# Altium footprint library con-samtec.PCBLIB: 805 footprints (part 21 of 55)
Each footprint in its own frame and in the unit in brackets; x right, y up, seen from the top. Pads: shape width x height; smd on the part's side, far side on the other; paste and mask are expansions set on the pad; w line width, h text height; cw(c..) or ccw(c..) is an arc to the next point about the centre after c.
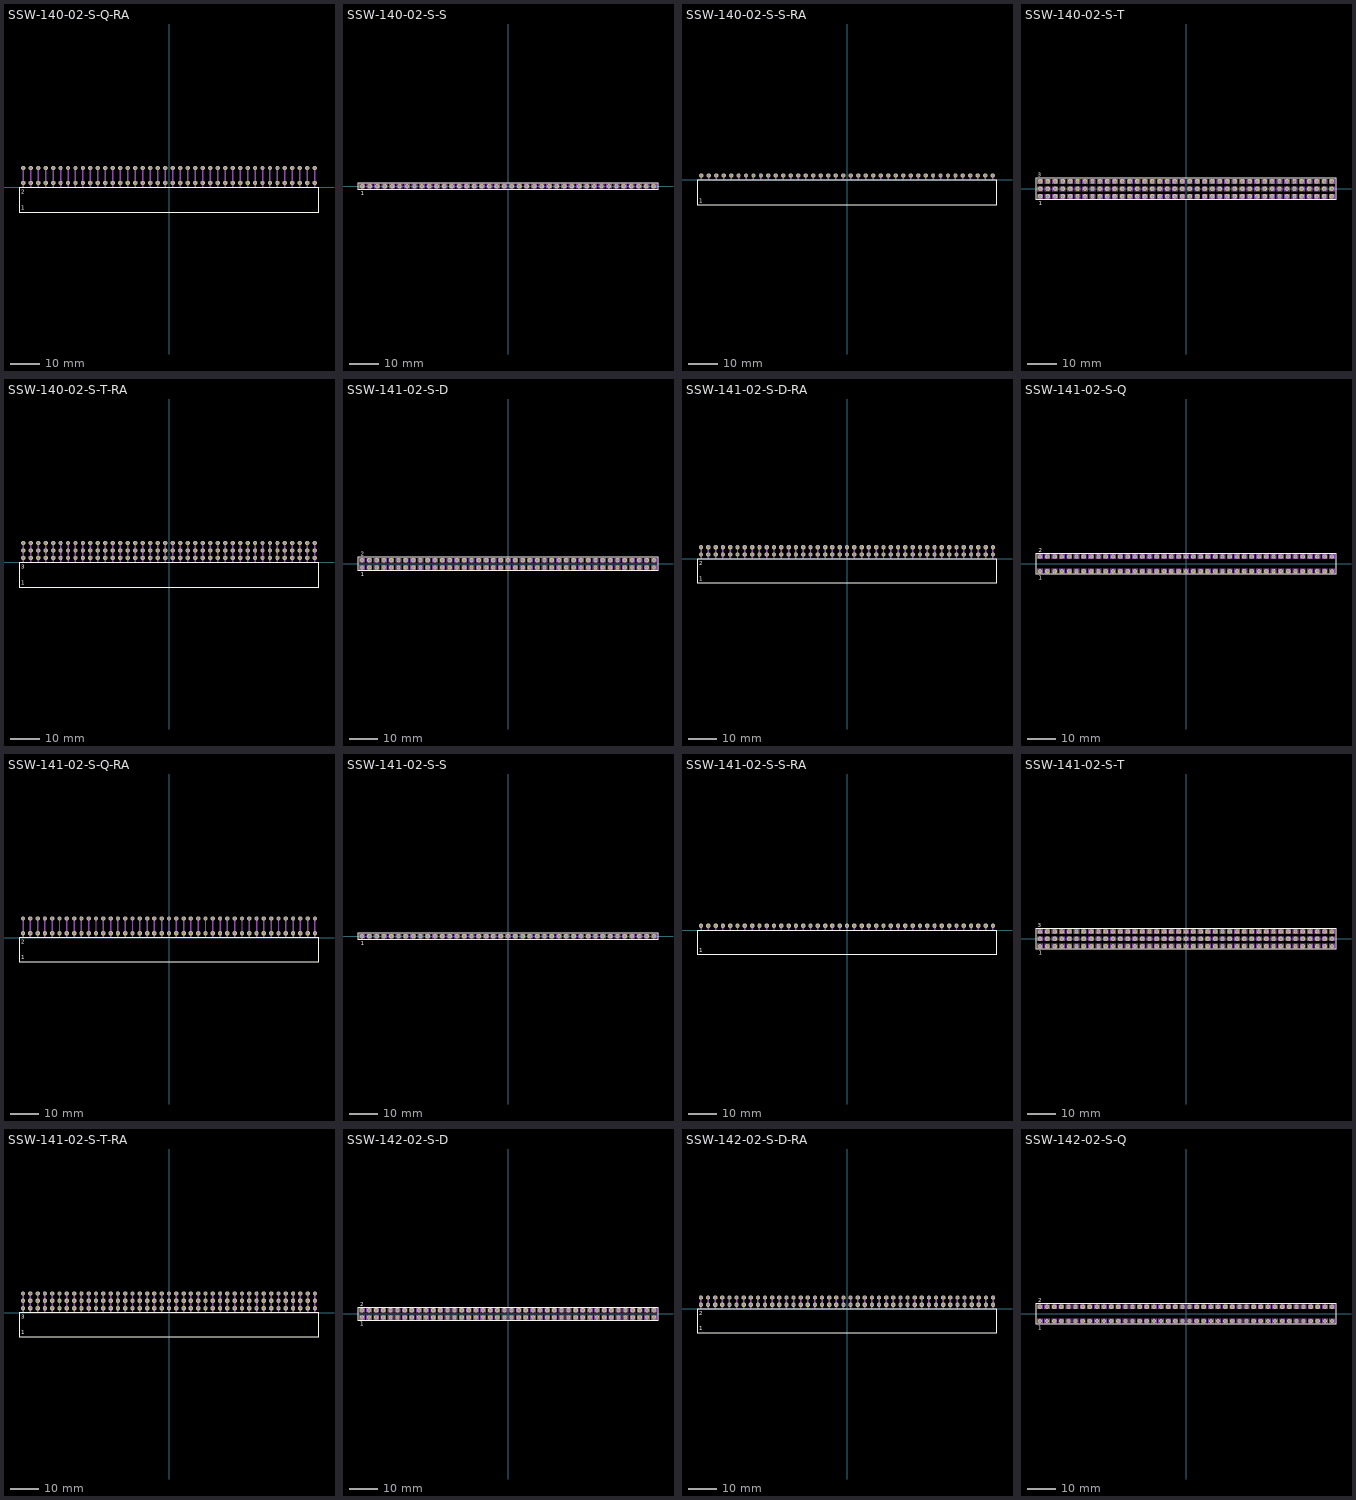
[diagram p20: the footprints below, top view; thin cyan lines are the x and y axes]

## SSW-140-02-S-Q-RA [mil]
pads (80):
  oct 59.06x59.06 hole 39.37: 1(-1950,60) 2(-1950,260) 3(-1850,60) 4(-1850,260) 5(-1750,60) 6(-1750,260) 7(-1650,60) 8(-1650,260) 9(-1550,60) 10(-1550,260) 11(-1450,60) 12(-1450,260) 13(-1350,60) 14(-1350,260) 15(-1250,60) 16(-1250,260) 17(-1150,60) 18(-1150,260) 19(-1050,60) 20(-1050,260) 21(-950,60) 22(-950,260) 23(-850,60) 24(-850,260) 25(-750,60) 26(-750,260) 27(-650,60) 28(-650,260) 29(-550,60) 30(-550,260) 31(-450,60) 32(-450,260) 33(-350,60) 34(-350,260) 35(-250,60) 36(-250,260) 37(-150,60) 38(-150,260) 39(-50,60) 40(-50,260) 41(50,60) 42(50,260) 43(150,60) 44(150,260) 45(250,60) 46(250,260) 47(350,60) 48(350,260) 49(450,60) 50(450,260) 51(550,60) 52(550,260) 53(650,60) 54(650,260) 55(750,60) 56(750,260) 57(850,60) 58(850,260) 59(950,60) 60(950,260) 61(1050,60) 62(1050,260) 63(1150,60) 64(1150,260) 65(1250,60) 66(1250,260) 67(1350,60) 68(1350,260) 69(1450,60) 70(1450,260) 71(1550,60) 72(1550,260) 73(1650,60) 74(1650,260) 75(1750,60) 76(1750,260) 77(1850,60) 78(1850,260) 79(1950,60) 80(1950,260)
Top Overlay:
  lines w8: -2005.08,-330.55 2005.08,-330.55 2005.08,-4.17 -2005.08,-4.17 -2005.08,-330.55
  text "1" at -1973.43,-301.18 h56.1
  text "2" at -1976.38,-86.61 h56.1
Mechanical 16:
  rectangle: -1960,0 -1940,270
  rectangle: -1860,0 -1840,270
  rectangle: -1760,0 -1740,270
  rectangle: -1660,0 -1640,270
  rectangle: -1560,0 -1540,270
  rectangle: -1460,0 -1440,270
  rectangle: -1360,0 -1340,270
  rectangle: -1260,0 -1240,270
  rectangle: -1160,0 -1140,270
  rectangle: -1060,0 -1040,270
  rectangle: -960,0 -940,270
  rectangle: -860,0 -840,270
  rectangle: -760,0 -740,270
  rectangle: -660,0 -640,270
  rectangle: -560,0 -540,270
  rectangle: -460,0 -440,270
  rectangle: -360,0 -340,270
  rectangle: -260,0 -240,270
  rectangle: -160,0 -140,270
  rectangle: -60,0 -40,270
  rectangle: 40,0 60,270
  rectangle: 140,0 160,270
  rectangle: 240,0 260,270
  rectangle: 340,0 360,270
  rectangle: 440,0 460,270
  rectangle: 540,0 560,270
  rectangle: 640,0 660,270
  rectangle: 740,0 760,270
  rectangle: 840,0 860,270
  rectangle: 940,0 960,270
  rectangle: 1040,0 1060,270
  rectangle: 1140,0 1160,270
  rectangle: 1240,0 1260,270
  rectangle: 1340,0 1360,270
  rectangle: 1440,0 1460,270
  rectangle: 1540,0 1560,270
  rectangle: 1640,0 1660,270
  rectangle: 1740,0 1760,270
  rectangle: 1840,0 1860,270
  rectangle: 1940,0 1960,270

## SSW-140-02-S-S [mm]
pads (40):
  oct 1.5x1.5 hole 1: 1(-49.53,0) 2(-46.99,0) 3(-44.45,0) 4(-41.91,0) 5(-39.37,0) 6(-36.83,0) 7(-34.29,0) 8(-31.75,0) 9(-29.21,0) 10(-26.67,0) 11(-24.13,0) 12(-21.59,0) 13(-19.05,0) 14(-16.51,0) 15(-13.97,0) 16(-11.43,0) 17(-8.89,0) 18(-6.35,0) 19(-3.81,0) 20(-1.27,0) 21(1.27,0) 22(3.81,0) 23(6.35,0) 24(8.89,0) 25(11.43,0) 26(13.97,0) 27(16.51,0) 28(19.05,0) 29(21.59,0) 30(24.13,0) 31(26.67,0) 32(29.21,0) 33(31.75,0) 34(34.29,0) 35(36.83,0) 36(39.37,0) 37(41.91,0) 38(44.45,0) 39(46.99,0) 40(49.53,0)
Top Overlay:
  lines w0.203: -50.929,-1.155 50.929,-1.155 50.929,1.155 -50.929,1.155 -50.929,-1.155
  text "1" at -50.038,-3.048 h1.42
Mechanical 16:
  drawing of 160 lines, arcs and shapes, not listed

## SSW-140-02-S-S-RA [mil]
pads (40):
  oct 59.06x59.06 hole 39.37: 1(-1950,60) 2(-1850,60) 3(-1750,60) 4(-1650,60) 5(-1550,60) 6(-1450,60) 7(-1350,60) 8(-1250,60) 9(-1150,60) 10(-1050,60) 11(-950,60) 12(-850,60) 13(-750,60) 14(-650,60) 15(-550,60) 16(-450,60) 17(-350,60) 18(-250,60) 19(-150,60) 20(-50,60) 21(50,60) 22(150,60) 23(250,60) 24(350,60) 25(450,60) 26(550,60) 27(650,60) 28(750,60) 29(850,60) 30(950,60) 31(1050,60) 32(1150,60) 33(1250,60) 34(1350,60) 35(1450,60) 36(1550,60) 37(1650,60) 38(1750,60) 39(1850,60) 40(1950,60)
Top Overlay:
  lines w8: -2005.08,-330.55 2005.08,-330.55 2005.08,-4.17 -2005.08,-4.17 -2005.08,-330.55
  text "1" at -1973.43,-301.18 h56.1
Mechanical 16:
  rectangle: -1960,0 -1940,70
  rectangle: -1860,0 -1840,70
  rectangle: -1760,0 -1740,70
  rectangle: -1660,0 -1640,70
  rectangle: -1560,0 -1540,70
  rectangle: -1460,0 -1440,70
  rectangle: -1360,0 -1340,70
  rectangle: -1260,0 -1240,70
  rectangle: -1160,0 -1140,70
  rectangle: -1060,0 -1040,70
  rectangle: -960,0 -940,70
  rectangle: -860,0 -840,70
  rectangle: -760,0 -740,70
  rectangle: -660,0 -640,70
  rectangle: -560,0 -540,70
  rectangle: -460,0 -440,70
  rectangle: -360,0 -340,70
  rectangle: -260,0 -240,70
  rectangle: -160,0 -140,70
  rectangle: -60,0 -40,70
  rectangle: 40,0 60,70
  rectangle: 140,0 160,70
  rectangle: 240,0 260,70
  rectangle: 340,0 360,70
  rectangle: 440,0 460,70
  rectangle: 540,0 560,70
  rectangle: 640,0 660,70
  rectangle: 740,0 760,70
  rectangle: 840,0 860,70
  rectangle: 940,0 960,70
  rectangle: 1040,0 1060,70
  rectangle: 1140,0 1160,70
  rectangle: 1240,0 1260,70
  rectangle: 1340,0 1360,70
  rectangle: 1440,0 1460,70
  rectangle: 1540,0 1560,70
  rectangle: 1640,0 1660,70
  rectangle: 1740,0 1760,70
  rectangle: 1840,0 1860,70
  rectangle: 1940,0 1960,70

## SSW-140-02-S-T [mm]
pads (120):
  oct 1.5x1.5 hole 1: 1(-49.53,-2.54) 2(-49.53,0) 3(-49.53,2.54) 4(-46.99,-2.54) 5(-46.99,0) 6(-46.99,2.54) 7(-44.45,-2.54) 8(-44.45,0) 9(-44.45,2.54) 10(-41.91,-2.54) 11(-41.91,0) 12(-41.91,2.54) 13(-39.37,-2.54) 14(-39.37,0) 15(-39.37,2.54) 16(-36.83,-2.54) 17(-36.83,0) 18(-36.83,2.54) 19(-34.29,-2.54) 20(-34.29,0) 21(-34.29,2.54) 22(-31.75,-2.54) 23(-31.75,0) 24(-31.75,2.54) 25(-29.21,-2.54) 26(-29.21,0) 27(-29.21,2.54) 28(-26.67,-2.54) 29(-26.67,0) 30(-26.67,2.54) 31(-24.13,-2.54) 32(-24.13,0) 33(-24.13,2.54) 34(-21.59,-2.54) 35(-21.59,0) 36(-21.59,2.54) 37(-19.05,-2.54) 38(-19.05,0) 39(-19.05,2.54) 40(-16.51,-2.54) 41(-16.51,0) 42(-16.51,2.54) 43(-13.97,-2.54) 44(-13.97,0) 45(-13.97,2.54) 46(-11.43,-2.54) 47(-11.43,0) 48(-11.43,2.54) 49(-8.89,-2.54) 50(-8.89,0) 51(-8.89,2.54) 52(-6.35,-2.54) 53(-6.35,0) 54(-6.35,2.54) 55(-3.81,-2.54) 56(-3.81,0) 57(-3.81,2.54) 58(-1.27,-2.54) 59(-1.27,0) 60(-1.27,2.54) 61(1.27,-2.54) 62(1.27,0) 63(1.27,2.54) 64(3.81,-2.54) 65(3.81,0) 66(3.81,2.54) 67(6.35,-2.54) 68(6.35,0) 69(6.35,2.54) 70(8.89,-2.54) 71(8.89,0) 72(8.89,2.54) 73(11.43,-2.54) 74(11.43,0) 75(11.43,2.54) 76(13.97,-2.54) 77(13.97,0) 78(13.97,2.54) 79(16.51,-2.54) 80(16.51,0) 81(16.51,2.54) 82(19.05,-2.54) 83(19.05,0) 84(19.05,2.54) 85(21.59,-2.54) 86(21.59,0) 87(21.59,2.54) 88(24.13,-2.54) 89(24.13,0) 90(24.13,2.54) 91(26.67,-2.54) 92(26.67,0) 93(26.67,2.54) 94(29.21,-2.54) 95(29.21,0) 96(29.21,2.54) 97(31.75,-2.54) 98(31.75,0) 99(31.75,2.54) 100(34.29,-2.54) 101(34.29,0) 102(34.29,2.54) 103(36.83,-2.54) 104(36.83,0) 105(36.83,2.54) 106(39.37,-2.54) 107(39.37,0) 108(39.37,2.54) 109(41.91,-2.54) 110(41.91,0) 111(41.91,2.54) 112(44.45,-2.54) 113(44.45,0) 114(44.45,2.54) 115(46.99,-2.54) 116(46.99,0) 117(46.99,2.54) 118(49.53,-2.54) 119(49.53,0) 120(49.53,2.54)
Top Overlay:
  lines w0.203: -50.929,-3.695 50.929,-3.695 50.929,3.695 -50.929,3.695 -50.929,-3.695
  text "1" at -50.038,-5.588 h1.42
  text "3" at -50.292,4.064 h1.42
Mechanical 16:
  drawing of 480 lines, arcs and shapes, not listed

## SSW-140-02-S-T-RA [mil]
pads (120):
  oct 59.06x59.06 hole 39.37: 1(-1950,60) 2(-1950,160) 3(-1950,260) 4(-1850,60) 5(-1850,160) 6(-1850,260) 7(-1750,60) 8(-1750,160) 9(-1750,260) 10(-1650,60) 11(-1650,160) 12(-1650,260) 13(-1550,60) 14(-1550,160) 15(-1550,260) 16(-1450,60) 17(-1450,160) 18(-1450,260) 19(-1350,60) 20(-1350,160) 21(-1350,260) 22(-1250,60) 23(-1250,160) 24(-1250,260) 25(-1150,60) 26(-1150,160) 27(-1150,260) 28(-1050,60) 29(-1050,160) 30(-1050,260) 31(-950,60) 32(-950,160) 33(-950,260) 34(-850,60) 35(-850,160) 36(-850,260) 37(-750,60) 38(-750,160) 39(-750,260) 40(-650,60) 41(-650,160) 42(-650,260) 43(-550,60) 44(-550,160) 45(-550,260) 46(-450,60) 47(-450,160) 48(-450,260) 49(-350,60) 50(-350,160) 51(-350,260) 52(-250,60) 53(-250,160) 54(-250,260) 55(-150,60) 56(-150,160) 57(-150,260) 58(-50,60) 59(-50,160) 60(-50,260) 61(50,60) 62(50,160) 63(50,260) 64(150,60) 65(150,160) 66(150,260) 67(250,60) 68(250,160) 69(250,260) 70(350,60) 71(350,160) 72(350,260) 73(450,60) 74(450,160) 75(450,260) 76(550,60) 77(550,160) 78(550,260) 79(650,60) 80(650,160) 81(650,260) 82(750,60) 83(750,160) 84(750,260) 85(850,60) 86(850,160) 87(850,260) 88(950,60) 89(950,160) 90(950,260) 91(1050,60) 92(1050,160) 93(1050,260) 94(1150,60) 95(1150,160) 96(1150,260) 97(1250,60) 98(1250,160) 99(1250,260) 100(1350,60) 101(1350,160) 102(1350,260) 103(1450,60) 104(1450,160) 105(1450,260) 106(1550,60) 107(1550,160) 108(1550,260) 109(1650,60) 110(1650,160) 111(1650,260) 112(1750,60) 113(1750,160) 114(1750,260) 115(1850,60) 116(1850,160) 117(1850,260) 118(1950,60) 119(1950,160) 120(1950,260)
Top Overlay:
  lines w8: -2005.08,-330.55 2005.08,-330.55 2005.08,-4.17 -2005.08,-4.17 -2005.08,-330.55
  text "1" at -1973.43,-301.18 h56.1
  text "3" at -1976.38,-86.61 h56.1
Mechanical 16:
  rectangle: -1960,0 -1940,270
  rectangle: -1860,0 -1840,270
  rectangle: -1760,0 -1740,270
  rectangle: -1660,0 -1640,270
  rectangle: -1560,0 -1540,270
  rectangle: -1460,0 -1440,270
  rectangle: -1360,0 -1340,270
  rectangle: -1260,0 -1240,270
  rectangle: -1160,0 -1140,270
  rectangle: -1060,0 -1040,270
  rectangle: -960,0 -940,270
  rectangle: -860,0 -840,270
  rectangle: -760,0 -740,270
  rectangle: -660,0 -640,270
  rectangle: -560,0 -540,270
  rectangle: -460,0 -440,270
  rectangle: -360,0 -340,270
  rectangle: -260,0 -240,270
  rectangle: -160,0 -140,270
  rectangle: -60,0 -40,270
  rectangle: 40,0 60,270
  rectangle: 140,0 160,270
  rectangle: 240,0 260,270
  rectangle: 340,0 360,270
  rectangle: 440,0 460,270
  rectangle: 540,0 560,270
  rectangle: 640,0 660,270
  rectangle: 740,0 760,270
  rectangle: 840,0 860,270
  rectangle: 940,0 960,270
  rectangle: 1040,0 1060,270
  rectangle: 1140,0 1160,270
  rectangle: 1240,0 1260,270
  rectangle: 1340,0 1360,270
  rectangle: 1440,0 1460,270
  rectangle: 1540,0 1560,270
  rectangle: 1640,0 1660,270
  rectangle: 1740,0 1760,270
  rectangle: 1840,0 1860,270
  rectangle: 1940,0 1960,270

## SSW-141-02-S-D [mm]
pads (82):
  oct 1.5x1.5 hole 1: 1(-50.8,-1.27) 2(-50.8,1.27) 3(-48.26,-1.27) 4(-48.26,1.27) 5(-45.72,-1.27) 6(-45.72,1.27) 7(-43.18,-1.27) 8(-43.18,1.27) 9(-40.64,-1.27) 10(-40.64,1.27) 11(-38.1,-1.27) 12(-38.1,1.27) 13(-35.56,-1.27) 14(-35.56,1.27) 15(-33.02,-1.27) 16(-33.02,1.27) 17(-30.48,-1.27) 18(-30.48,1.27) 19(-27.94,-1.27) 20(-27.94,1.27) 21(-25.4,-1.27) 22(-25.4,1.27) 23(-22.86,-1.27) 24(-22.86,1.27) 25(-20.32,-1.27) 26(-20.32,1.27) 27(-17.78,-1.27) 28(-17.78,1.27) 29(-15.24,-1.27) 30(-15.24,1.27) 31(-12.7,-1.27) 32(-12.7,1.27) 33(-10.16,-1.27) 34(-10.16,1.27) 35(-7.62,-1.27) 36(-7.62,1.27) 37(-5.08,-1.27) 38(-5.08,1.27) 39(-2.54,-1.27) 40(-2.54,1.27) 41(0,-1.27) 42(0,1.27) 43(2.54,-1.27) 44(2.54,1.27) 45(5.08,-1.27) 46(5.08,1.27) 47(7.62,-1.27) 48(7.62,1.27) 49(10.16,-1.27) 50(10.16,1.27) 51(12.7,-1.27) 52(12.7,1.27) 53(15.24,-1.27) 54(15.24,1.27) 55(17.78,-1.27) 56(17.78,1.27) 57(20.32,-1.27) 58(20.32,1.27) 59(22.86,-1.27) 60(22.86,1.27) 61(25.4,-1.27) 62(25.4,1.27) 63(27.94,-1.27) 64(27.94,1.27) 65(30.48,-1.27) 66(30.48,1.27) 67(33.02,-1.27) 68(33.02,1.27) 69(35.56,-1.27) 70(35.56,1.27) 71(38.1,-1.27) 72(38.1,1.27) 73(40.64,-1.27) 74(40.64,1.27) 75(43.18,-1.27) 76(43.18,1.27) 77(45.72,-1.27) 78(45.72,1.27) 79(48.26,-1.27) 80(48.26,1.27) 81(50.8,-1.27) 82(50.8,1.27)
Top Overlay:
  lines w0.203: -52.199,-2.425 52.199,-2.425 52.199,2.425 -52.199,2.425 -52.199,-2.425
  text "1" at -51.308,-4.318 h1.42
  text "2" at -51.308,2.794 h1.42
Mechanical 16:
  drawing of 328 lines, arcs and shapes, not listed

## SSW-141-02-S-D-RA [mil]
pads (82):
  oct 59.06x59.06 hole 39.37: 1(-2000,60) 2(-2000,160) 3(-1900,60) 4(-1900,160) 5(-1800,60) 6(-1800,160) 7(-1700,60) 8(-1700,160) 9(-1600,60) 10(-1600,160) 11(-1500,60) 12(-1500,160) 13(-1400,60) 14(-1400,160) 15(-1300,60) 16(-1300,160) 17(-1200,60) 18(-1200,160) 19(-1100,60) 20(-1100,160) 21(-1000,60) 22(-1000,160) 23(-900,60) 24(-900,160) 25(-800,60) 26(-800,160) 27(-700,60) 28(-700,160) 29(-600,60) 30(-600,160) 31(-500,60) 32(-500,160) 33(-400,60) 34(-400,160) 35(-300,60) 36(-300,160) 37(-200,60) 38(-200,160) 39(-100,60) 40(-100,160) 41(0,60) 42(0,160) 43(100,60) 44(100,160) 45(200,60) 46(200,160) 47(300,60) 48(300,160) 49(400,60) 50(400,160) 51(500,60) 52(500,160) 53(600,60) 54(600,160) 55(700,60) 56(700,160) 57(800,60) 58(800,160) 59(900,60) 60(900,160) 61(1000,60) 62(1000,160) 63(1100,60) 64(1100,160) 65(1200,60) 66(1200,160) 67(1300,60) 68(1300,160) 69(1400,60) 70(1400,160) 71(1500,60) 72(1500,160) 73(1600,60) 74(1600,160) 75(1700,60) 76(1700,160) 77(1800,60) 78(1800,160) 79(1900,60) 80(1900,160) 81(2000,60) 82(2000,160)
Top Overlay:
  lines w8: -2055.08,-330.55 2055.08,-330.55 2055.08,-4.17 -2055.08,-4.17 -2055.08,-330.55
  text "1" at -2023.43,-301.18 h56.1
  text "2" at -2026.38,-86.61 h56.1
Mechanical 16:
  rectangle: -2010,0 -1990,170
  rectangle: -1910,0 -1890,170
  rectangle: -1810,0 -1790,170
  rectangle: -1710,0 -1690,170
  rectangle: -1610,0 -1590,170
  rectangle: -1510,0 -1490,170
  rectangle: -1410,0 -1390,170
  rectangle: -1310,0 -1290,170
  rectangle: -1210,0 -1190,170
  rectangle: -1110,0 -1090,170
  rectangle: -1010,0 -990,170
  rectangle: -910,0 -890,170
  rectangle: -810,0 -790,170
  rectangle: -710,0 -690,170
  rectangle: -610,0 -590,170
  rectangle: -510,0 -490,170
  rectangle: -410,0 -390,170
  rectangle: -310,0 -290,170
  rectangle: -210,0 -190,170
  rectangle: -110,0 -90,170
  rectangle: -10,0 10,170
  rectangle: 90,0 110,170
  rectangle: 190,0 210,170
  rectangle: 290,0 310,170
  rectangle: 390,0 410,170
  rectangle: 490,0 510,170
  rectangle: 590,0 610,170
  rectangle: 690,0 710,170
  rectangle: 790,0 810,170
  rectangle: 890,0 910,170
  rectangle: 990,0 1010,170
  rectangle: 1090,0 1110,170
  rectangle: 1190,0 1210,170
  rectangle: 1290,0 1310,170
  rectangle: 1390,0 1410,170
  rectangle: 1490,0 1510,170
  rectangle: 1590,0 1610,170
  rectangle: 1690,0 1710,170
  rectangle: 1790,0 1810,170
  rectangle: 1890,0 1910,170
  rectangle: 1990,0 2010,170

## SSW-141-02-S-Q [mm]
pads (82):
  oct 1.5x1.5 hole 1: 1(-50.8,-2.54) 2(-50.8,2.54) 3(-48.26,-2.54) 4(-48.26,2.54) 5(-45.72,-2.54) 6(-45.72,2.54) 7(-43.18,-2.54) 8(-43.18,2.54) 9(-40.64,-2.54) 10(-40.64,2.54) 11(-38.1,-2.54) 12(-38.1,2.54) 13(-35.56,-2.54) 14(-35.56,2.54) 15(-33.02,-2.54) 16(-33.02,2.54) 17(-30.48,-2.54) 18(-30.48,2.54) 19(-27.94,-2.54) 20(-27.94,2.54) 21(-25.4,-2.54) 22(-25.4,2.54) 23(-22.86,-2.54) 24(-22.86,2.54) 25(-20.32,-2.54) 26(-20.32,2.54) 27(-17.78,-2.54) 28(-17.78,2.54) 29(-15.24,-2.54) 30(-15.24,2.54) 31(-12.7,-2.54) 32(-12.7,2.54) 33(-10.16,-2.54) 34(-10.16,2.54) 35(-7.62,-2.54) 36(-7.62,2.54) 37(-5.08,-2.54) 38(-5.08,2.54) 39(-2.54,-2.54) 40(-2.54,2.54) 41(0,-2.54) 42(0,2.54) 43(2.54,-2.54) 44(2.54,2.54) 45(5.08,-2.54) 46(5.08,2.54) 47(7.62,-2.54) 48(7.62,2.54) 49(10.16,-2.54) 50(10.16,2.54) 51(12.7,-2.54) 52(12.7,2.54) 53(15.24,-2.54) 54(15.24,2.54) 55(17.78,-2.54) 56(17.78,2.54) 57(20.32,-2.54) 58(20.32,2.54) 59(22.86,-2.54) 60(22.86,2.54) 61(25.4,-2.54) 62(25.4,2.54) 63(27.94,-2.54) 64(27.94,2.54) 65(30.48,-2.54) 66(30.48,2.54) 67(33.02,-2.54) 68(33.02,2.54) 69(35.56,-2.54) 70(35.56,2.54) 71(38.1,-2.54) 72(38.1,2.54) 73(40.64,-2.54) 74(40.64,2.54) 75(43.18,-2.54) 76(43.18,2.54) 77(45.72,-2.54) 78(45.72,2.54) 79(48.26,-2.54) 80(48.26,2.54) 81(50.8,-2.54) 82(50.8,2.54)
Top Overlay:
  lines w0.203: -52.199,-3.695 52.199,-3.695 52.199,3.695 -52.199,3.695 -52.199,-3.695
  text "1" at -51.308,-5.588 h1.42
  text "2" at -51.308,4.064 h1.42
Mechanical 16:
  drawing of 328 lines, arcs and shapes, not listed

## SSW-141-02-S-Q-RA [mil]
pads (82):
  oct 59.06x59.06 hole 39.37: 1(-2000,60) 2(-2000,260) 3(-1900,60) 4(-1900,260) 5(-1800,60) 6(-1800,260) 7(-1700,60) 8(-1700,260) 9(-1600,60) 10(-1600,260) 11(-1500,60) 12(-1500,260) 13(-1400,60) 14(-1400,260) 15(-1300,60) 16(-1300,260) 17(-1200,60) 18(-1200,260) 19(-1100,60) 20(-1100,260) 21(-1000,60) 22(-1000,260) 23(-900,60) 24(-900,260) 25(-800,60) 26(-800,260) 27(-700,60) 28(-700,260) 29(-600,60) 30(-600,260) 31(-500,60) 32(-500,260) 33(-400,60) 34(-400,260) 35(-300,60) 36(-300,260) 37(-200,60) 38(-200,260) 39(-100,60) 40(-100,260) 41(0,60) 42(0,260) 43(100,60) 44(100,260) 45(200,60) 46(200,260) 47(300,60) 48(300,260) 49(400,60) 50(400,260) 51(500,60) 52(500,260) 53(600,60) 54(600,260) 55(700,60) 56(700,260) 57(800,60) 58(800,260) 59(900,60) 60(900,260) 61(1000,60) 62(1000,260) 63(1100,60) 64(1100,260) 65(1200,60) 66(1200,260) 67(1300,60) 68(1300,260) 69(1400,60) 70(1400,260) 71(1500,60) 72(1500,260) 73(1600,60) 74(1600,260) 75(1700,60) 76(1700,260) 77(1800,60) 78(1800,260) 79(1900,60) 80(1900,260) 81(2000,60) 82(2000,260)
Top Overlay:
  lines w8: -2055.08,-330.55 2055.08,-330.55 2055.08,-4.17 -2055.08,-4.17 -2055.08,-330.55
  text "1" at -2023.43,-301.18 h56.1
  text "2" at -2026.38,-86.61 h56.1
Mechanical 16:
  rectangle: -2010,0 -1990,270
  rectangle: -1910,0 -1890,270
  rectangle: -1810,0 -1790,270
  rectangle: -1710,0 -1690,270
  rectangle: -1610,0 -1590,270
  rectangle: -1510,0 -1490,270
  rectangle: -1410,0 -1390,270
  rectangle: -1310,0 -1290,270
  rectangle: -1210,0 -1190,270
  rectangle: -1110,0 -1090,270
  rectangle: -1010,0 -990,270
  rectangle: -910,0 -890,270
  rectangle: -810,0 -790,270
  rectangle: -710,0 -690,270
  rectangle: -610,0 -590,270
  rectangle: -510,0 -490,270
  rectangle: -410,0 -390,270
  rectangle: -310,0 -290,270
  rectangle: -210,0 -190,270
  rectangle: -110,0 -90,270
  rectangle: -10,0 10,270
  rectangle: 90,0 110,270
  rectangle: 190,0 210,270
  rectangle: 290,0 310,270
  rectangle: 390,0 410,270
  rectangle: 490,0 510,270
  rectangle: 590,0 610,270
  rectangle: 690,0 710,270
  rectangle: 790,0 810,270
  rectangle: 890,0 910,270
  rectangle: 990,0 1010,270
  rectangle: 1090,0 1110,270
  rectangle: 1190,0 1210,270
  rectangle: 1290,0 1310,270
  rectangle: 1390,0 1410,270
  rectangle: 1490,0 1510,270
  rectangle: 1590,0 1610,270
  rectangle: 1690,0 1710,270
  rectangle: 1790,0 1810,270
  rectangle: 1890,0 1910,270
  rectangle: 1990,0 2010,270

## SSW-141-02-S-S [mm]
pads (41):
  oct 1.5x1.5 hole 1: 1(-50.8,0) 2(-48.26,0) 3(-45.72,0) 4(-43.18,0) 5(-40.64,0) 6(-38.1,0) 7(-35.56,0) 8(-33.02,0) 9(-30.48,0) 10(-27.94,0) 11(-25.4,0) 12(-22.86,0) 13(-20.32,0) 14(-17.78,0) 15(-15.24,0) 16(-12.7,0) 17(-10.16,0) 18(-7.62,0) 19(-5.08,0) 20(-2.54,0) 21(0,0) 22(2.54,0) 23(5.08,0) 24(7.62,0) 25(10.16,0) 26(12.7,0) 27(15.24,0) 28(17.78,0) 29(20.32,0) 30(22.86,0) 31(25.4,0) 32(27.94,0) 33(30.48,0) 34(33.02,0) 35(35.56,0) 36(38.1,0) 37(40.64,0) 38(43.18,0) 39(45.72,0) 40(48.26,0) 41(50.8,0)
Top Overlay:
  lines w0.203: -52.199,-1.155 52.199,-1.155 52.199,1.155 -52.199,1.155 -52.199,-1.155
  text "1" at -51.308,-3.048 h1.42
Mechanical 16:
  drawing of 164 lines, arcs and shapes, not listed

## SSW-141-02-S-S-RA [mil]
pads (41):
  oct 59.06x59.06 hole 39.37: 1(-2000,60) 2(-1900,60) 3(-1800,60) 4(-1700,60) 5(-1600,60) 6(-1500,60) 7(-1400,60) 8(-1300,60) 9(-1200,60) 10(-1100,60) 11(-1000,60) 12(-900,60) 13(-800,60) 14(-700,60) 15(-600,60) 16(-500,60) 17(-400,60) 18(-300,60) 19(-200,60) 20(-100,60) 21(0,60) 22(100,60) 23(200,60) 24(300,60) 25(400,60) 26(500,60) 27(600,60) 28(700,60) 29(800,60) 30(900,60) 31(1000,60) 32(1100,60) 33(1200,60) 34(1300,60) 35(1400,60) 36(1500,60) 37(1600,60) 38(1700,60) 39(1800,60) 40(1900,60) 41(2000,60)
Top Overlay:
  lines w8: -2055.08,-330.55 2055.08,-330.55 2055.08,-4.17 -2055.08,-4.17 -2055.08,-330.55
  text "1" at -2023.43,-301.18 h56.1
Mechanical 16:
  rectangle: -2010,0 -1990,70
  rectangle: -1910,0 -1890,70
  rectangle: -1810,0 -1790,70
  rectangle: -1710,0 -1690,70
  rectangle: -1610,0 -1590,70
  rectangle: -1510,0 -1490,70
  rectangle: -1410,0 -1390,70
  rectangle: -1310,0 -1290,70
  rectangle: -1210,0 -1190,70
  rectangle: -1110,0 -1090,70
  rectangle: -1010,0 -990,70
  rectangle: -910,0 -890,70
  rectangle: -810,0 -790,70
  rectangle: -710,0 -690,70
  rectangle: -610,0 -590,70
  rectangle: -510,0 -490,70
  rectangle: -410,0 -390,70
  rectangle: -310,0 -290,70
  rectangle: -210,0 -190,70
  rectangle: -110,0 -90,70
  rectangle: -10,0 10,70
  rectangle: 90,0 110,70
  rectangle: 190,0 210,70
  rectangle: 290,0 310,70
  rectangle: 390,0 410,70
  rectangle: 490,0 510,70
  rectangle: 590,0 610,70
  rectangle: 690,0 710,70
  rectangle: 790,0 810,70
  rectangle: 890,0 910,70
  rectangle: 990,0 1010,70
  rectangle: 1090,0 1110,70
  rectangle: 1190,0 1210,70
  rectangle: 1290,0 1310,70
  rectangle: 1390,0 1410,70
  rectangle: 1490,0 1510,70
  rectangle: 1590,0 1610,70
  rectangle: 1690,0 1710,70
  rectangle: 1790,0 1810,70
  rectangle: 1890,0 1910,70
  rectangle: 1990,0 2010,70

## SSW-141-02-S-T [mm]
pads (123):
  oct 1.5x1.5 hole 1: 1(-50.8,-2.54) 2(-50.8,0) 3(-50.8,2.54) 4(-48.26,-2.54) 5(-48.26,0) 6(-48.26,2.54) 7(-45.72,-2.54) 8(-45.72,0) 9(-45.72,2.54) 10(-43.18,-2.54) 11(-43.18,0) 12(-43.18,2.54) 13(-40.64,-2.54) 14(-40.64,0) 15(-40.64,2.54) 16(-38.1,-2.54) 17(-38.1,0) 18(-38.1,2.54) 19(-35.56,-2.54) 20(-35.56,0) 21(-35.56,2.54) 22(-33.02,-2.54) 23(-33.02,0) 24(-33.02,2.54) 25(-30.48,-2.54) 26(-30.48,0) 27(-30.48,2.54) 28(-27.94,-2.54) 29(-27.94,0) 30(-27.94,2.54) 31(-25.4,-2.54) 32(-25.4,0) 33(-25.4,2.54) 34(-22.86,-2.54) 35(-22.86,0) 36(-22.86,2.54) 37(-20.32,-2.54) 38(-20.32,0) 39(-20.32,2.54) 40(-17.78,-2.54) 41(-17.78,0) 42(-17.78,2.54) 43(-15.24,-2.54) 44(-15.24,0) 45(-15.24,2.54) 46(-12.7,-2.54) 47(-12.7,0) 48(-12.7,2.54) 49(-10.16,-2.54) 50(-10.16,0) 51(-10.16,2.54) 52(-7.62,-2.54) 53(-7.62,0) 54(-7.62,2.54) 55(-5.08,-2.54) 56(-5.08,0) 57(-5.08,2.54) 58(-2.54,-2.54) 59(-2.54,0) 60(-2.54,2.54) 61(0,-2.54) 62(0,0) 63(0,2.54) 64(2.54,-2.54) 65(2.54,0) 66(2.54,2.54) 67(5.08,-2.54) 68(5.08,0) 69(5.08,2.54) 70(7.62,-2.54) 71(7.62,0) 72(7.62,2.54) 73(10.16,-2.54) 74(10.16,0) 75(10.16,2.54) 76(12.7,-2.54) 77(12.7,0) 78(12.7,2.54) 79(15.24,-2.54) 80(15.24,0) 81(15.24,2.54) 82(17.78,-2.54) 83(17.78,0) 84(17.78,2.54) 85(20.32,-2.54) 86(20.32,0) 87(20.32,2.54) 88(22.86,-2.54) 89(22.86,0) 90(22.86,2.54) 91(25.4,-2.54) 92(25.4,0) 93(25.4,2.54) 94(27.94,-2.54) 95(27.94,0) 96(27.94,2.54) 97(30.48,-2.54) 98(30.48,0) 99(30.48,2.54) 100(33.02,-2.54) 101(33.02,0) 102(33.02,2.54) 103(35.56,-2.54) 104(35.56,0) 105(35.56,2.54) 106(38.1,-2.54) 107(38.1,0) 108(38.1,2.54) 109(40.64,-2.54) 110(40.64,0) 111(40.64,2.54) 112(43.18,-2.54) 113(43.18,0) 114(43.18,2.54) 115(45.72,-2.54) 116(45.72,0) 117(45.72,2.54) 118(48.26,-2.54) 119(48.26,0) 120(48.26,2.54) 121(50.8,-2.54) 122(50.8,0) 123(50.8,2.54)
Top Overlay:
  lines w0.203: -52.199,-3.695 52.199,-3.695 52.199,3.695 -52.199,3.695 -52.199,-3.695
  text "1" at -51.308,-5.588 h1.42
  text "3" at -51.562,4.064 h1.42
Mechanical 16:
  drawing of 492 lines, arcs and shapes, not listed

## SSW-141-02-S-T-RA [mil]
pads (123):
  oct 59.06x59.06 hole 39.37: 1(-2000,60) 2(-2000,160) 3(-2000,260) 4(-1900,60) 5(-1900,160) 6(-1900,260) 7(-1800,60) 8(-1800,160) 9(-1800,260) 10(-1700,60) 11(-1700,160) 12(-1700,260) 13(-1600,60) 14(-1600,160) 15(-1600,260) 16(-1500,60) 17(-1500,160) 18(-1500,260) 19(-1400,60) 20(-1400,160) 21(-1400,260) 22(-1300,60) 23(-1300,160) 24(-1300,260) 25(-1200,60) 26(-1200,160) 27(-1200,260) 28(-1100,60) 29(-1100,160) 30(-1100,260) 31(-1000,60) 32(-1000,160) 33(-1000,260) 34(-900,60) 35(-900,160) 36(-900,260) 37(-800,60) 38(-800,160) 39(-800,260) 40(-700,60) 41(-700,160) 42(-700,260) 43(-600,60) 44(-600,160) 45(-600,260) 46(-500,60) 47(-500,160) 48(-500,260) 49(-400,60) 50(-400,160) 51(-400,260) 52(-300,60) 53(-300,160) 54(-300,260) 55(-200,60) 56(-200,160) 57(-200,260) 58(-100,60) 59(-100,160) 60(-100,260) 61(0,60) 62(0,160) 63(0,260) 64(100,60) 65(100,160) 66(100,260) 67(200,60) 68(200,160) 69(200,260) 70(300,60) 71(300,160) 72(300,260) 73(400,60) 74(400,160) 75(400,260) 76(500,60) 77(500,160) 78(500,260) 79(600,60) 80(600,160) 81(600,260) 82(700,60) 83(700,160) 84(700,260) 85(800,60) 86(800,160) 87(800,260) 88(900,60) 89(900,160) 90(900,260) 91(1000,60) 92(1000,160) 93(1000,260) 94(1100,60) 95(1100,160) 96(1100,260) 97(1200,60) 98(1200,160) 99(1200,260) 100(1300,60) 101(1300,160) 102(1300,260) 103(1400,60) 104(1400,160) 105(1400,260) 106(1500,60) 107(1500,160) 108(1500,260) 109(1600,60) 110(1600,160) 111(1600,260) 112(1700,60) 113(1700,160) 114(1700,260) 115(1800,60) 116(1800,160) 117(1800,260) 118(1900,60) 119(1900,160) 120(1900,260) 121(2000,60) 122(2000,160) 123(2000,260)
Top Overlay:
  lines w8: -2055.08,-330.55 2055.08,-330.55 2055.08,-4.17 -2055.08,-4.17 -2055.08,-330.55
  text "1" at -2023.43,-301.18 h56.1
  text "3" at -2026.38,-86.61 h56.1
Mechanical 16:
  rectangle: -2010,0 -1990,270
  rectangle: -1910,0 -1890,270
  rectangle: -1810,0 -1790,270
  rectangle: -1710,0 -1690,270
  rectangle: -1610,0 -1590,270
  rectangle: -1510,0 -1490,270
  rectangle: -1410,0 -1390,270
  rectangle: -1310,0 -1290,270
  rectangle: -1210,0 -1190,270
  rectangle: -1110,0 -1090,270
  rectangle: -1010,0 -990,270
  rectangle: -910,0 -890,270
  rectangle: -810,0 -790,270
  rectangle: -710,0 -690,270
  rectangle: -610,0 -590,270
  rectangle: -510,0 -490,270
  rectangle: -410,0 -390,270
  rectangle: -310,0 -290,270
  rectangle: -210,0 -190,270
  rectangle: -110,0 -90,270
  rectangle: -10,0 10,270
  rectangle: 90,0 110,270
  rectangle: 190,0 210,270
  rectangle: 290,0 310,270
  rectangle: 390,0 410,270
  rectangle: 490,0 510,270
  rectangle: 590,0 610,270
  rectangle: 690,0 710,270
  rectangle: 790,0 810,270
  rectangle: 890,0 910,270
  rectangle: 990,0 1010,270
  rectangle: 1090,0 1110,270
  rectangle: 1190,0 1210,270
  rectangle: 1290,0 1310,270
  rectangle: 1390,0 1410,270
  rectangle: 1490,0 1510,270
  rectangle: 1590,0 1610,270
  rectangle: 1690,0 1710,270
  rectangle: 1790,0 1810,270
  rectangle: 1890,0 1910,270
  rectangle: 1990,0 2010,270

## SSW-142-02-S-D [mm]
pads (84):
  oct 1.5x1.5 hole 1: 1(-52.07,-1.27) 2(-52.07,1.27) 3(-49.53,-1.27) 4(-49.53,1.27) 5(-46.99,-1.27) 6(-46.99,1.27) 7(-44.45,-1.27) 8(-44.45,1.27) 9(-41.91,-1.27) 10(-41.91,1.27) 11(-39.37,-1.27) 12(-39.37,1.27) 13(-36.83,-1.27) 14(-36.83,1.27) 15(-34.29,-1.27) 16(-34.29,1.27) 17(-31.75,-1.27) 18(-31.75,1.27) 19(-29.21,-1.27) 20(-29.21,1.27) 21(-26.67,-1.27) 22(-26.67,1.27) 23(-24.13,-1.27) 24(-24.13,1.27) 25(-21.59,-1.27) 26(-21.59,1.27) 27(-19.05,-1.27) 28(-19.05,1.27) 29(-16.51,-1.27) 30(-16.51,1.27) 31(-13.97,-1.27) 32(-13.97,1.27) 33(-11.43,-1.27) 34(-11.43,1.27) 35(-8.89,-1.27) 36(-8.89,1.27) 37(-6.35,-1.27) 38(-6.35,1.27) 39(-3.81,-1.27) 40(-3.81,1.27) 41(-1.27,-1.27) 42(-1.27,1.27) 43(1.27,-1.27) 44(1.27,1.27) 45(3.81,-1.27) 46(3.81,1.27) 47(6.35,-1.27) 48(6.35,1.27) 49(8.89,-1.27) 50(8.89,1.27) 51(11.43,-1.27) 52(11.43,1.27) 53(13.97,-1.27) 54(13.97,1.27) 55(16.51,-1.27) 56(16.51,1.27) 57(19.05,-1.27) 58(19.05,1.27) 59(21.59,-1.27) 60(21.59,1.27) 61(24.13,-1.27) 62(24.13,1.27) 63(26.67,-1.27) 64(26.67,1.27) 65(29.21,-1.27) 66(29.21,1.27) 67(31.75,-1.27) 68(31.75,1.27) 69(34.29,-1.27) 70(34.29,1.27) 71(36.83,-1.27) 72(36.83,1.27) 73(39.37,-1.27) 74(39.37,1.27) 75(41.91,-1.27) 76(41.91,1.27) 77(44.45,-1.27) 78(44.45,1.27) 79(46.99,-1.27) 80(46.99,1.27) 81(49.53,-1.27) 82(49.53,1.27) 83(52.07,-1.27) 84(52.07,1.27)
Top Overlay:
  lines w0.203: -53.469,-2.425 53.469,-2.425 53.469,2.425 -53.469,2.425 -53.469,-2.425
  text "1" at -52.578,-4.318 h1.42
  text "2" at -52.578,2.794 h1.42
Mechanical 16:
  drawing of 336 lines, arcs and shapes, not listed

## SSW-142-02-S-D-RA [mil]
pads (84):
  oct 59.06x59.06 hole 39.37: 1(-2050,60) 2(-2050,160) 3(-1950,60) 4(-1950,160) 5(-1850,60) 6(-1850,160) 7(-1750,60) 8(-1750,160) 9(-1650,60) 10(-1650,160) 11(-1550,60) 12(-1550,160) 13(-1450,60) 14(-1450,160) 15(-1350,60) 16(-1350,160) 17(-1250,60) 18(-1250,160) 19(-1150,60) 20(-1150,160) 21(-1050,60) 22(-1050,160) 23(-950,60) 24(-950,160) 25(-850,60) 26(-850,160) 27(-750,60) 28(-750,160) 29(-650,60) 30(-650,160) 31(-550,60) 32(-550,160) 33(-450,60) 34(-450,160) 35(-350,60) 36(-350,160) 37(-250,60) 38(-250,160) 39(-150,60) 40(-150,160) 41(-50,60) 42(-50,160) 43(50,60) 44(50,160) 45(150,60) 46(150,160) 47(250,60) 48(250,160) 49(350,60) 50(350,160) 51(450,60) 52(450,160) 53(550,60) 54(550,160) 55(650,60) 56(650,160) 57(750,60) 58(750,160) 59(850,60) 60(850,160) 61(950,60) 62(950,160) 63(1050,60) 64(1050,160) 65(1150,60) 66(1150,160) 67(1250,60) 68(1250,160) 69(1350,60) 70(1350,160) 71(1450,60) 72(1450,160) 73(1550,60) 74(1550,160) 75(1650,60) 76(1650,160) 77(1750,60) 78(1750,160) 79(1850,60) 80(1850,160) 81(1950,60) 82(1950,160) 83(2050,60) 84(2050,160)
Top Overlay:
  lines w8: -2105.08,-330.55 2105.08,-330.55 2105.08,-4.17 -2105.08,-4.17 -2105.08,-330.55
  text "1" at -2073.43,-301.18 h56.1
  text "2" at -2076.38,-86.61 h56.1
Mechanical 16:
  rectangle: -2060,0 -2040,170
  rectangle: -1960,0 -1940,170
  rectangle: -1860,0 -1840,170
  rectangle: -1760,0 -1740,170
  rectangle: -1660,0 -1640,170
  rectangle: -1560,0 -1540,170
  rectangle: -1460,0 -1440,170
  rectangle: -1360,0 -1340,170
  rectangle: -1260,0 -1240,170
  rectangle: -1160,0 -1140,170
  rectangle: -1060,0 -1040,170
  rectangle: -960,0 -940,170
  rectangle: -860,0 -840,170
  rectangle: -760,0 -740,170
  rectangle: -660,0 -640,170
  rectangle: -560,0 -540,170
  rectangle: -460,0 -440,170
  rectangle: -360,0 -340,170
  rectangle: -260,0 -240,170
  rectangle: -160,0 -140,170
  rectangle: -60,0 -40,170
  rectangle: 40,0 60,170
  rectangle: 140,0 160,170
  rectangle: 240,0 260,170
  rectangle: 340,0 360,170
  rectangle: 440,0 460,170
  rectangle: 540,0 560,170
  rectangle: 640,0 660,170
  rectangle: 740,0 760,170
  rectangle: 840,0 860,170
  rectangle: 940,0 960,170
  rectangle: 1040,0 1060,170
  rectangle: 1140,0 1160,170
  rectangle: 1240,0 1260,170
  rectangle: 1340,0 1360,170
  rectangle: 1440,0 1460,170
  rectangle: 1540,0 1560,170
  rectangle: 1640,0 1660,170
  rectangle: 1740,0 1760,170
  rectangle: 1840,0 1860,170
  rectangle: 1940,0 1960,170
  rectangle: 2040,0 2060,170

## SSW-142-02-S-Q [mm]
pads (84):
  oct 1.5x1.5 hole 1: 1(-52.07,-2.54) 2(-52.07,2.54) 3(-49.53,-2.54) 4(-49.53,2.54) 5(-46.99,-2.54) 6(-46.99,2.54) 7(-44.45,-2.54) 8(-44.45,2.54) 9(-41.91,-2.54) 10(-41.91,2.54) 11(-39.37,-2.54) 12(-39.37,2.54) 13(-36.83,-2.54) 14(-36.83,2.54) 15(-34.29,-2.54) 16(-34.29,2.54) 17(-31.75,-2.54) 18(-31.75,2.54) 19(-29.21,-2.54) 20(-29.21,2.54) 21(-26.67,-2.54) 22(-26.67,2.54) 23(-24.13,-2.54) 24(-24.13,2.54) 25(-21.59,-2.54) 26(-21.59,2.54) 27(-19.05,-2.54) 28(-19.05,2.54) 29(-16.51,-2.54) 30(-16.51,2.54) 31(-13.97,-2.54) 32(-13.97,2.54) 33(-11.43,-2.54) 34(-11.43,2.54) 35(-8.89,-2.54) 36(-8.89,2.54) 37(-6.35,-2.54) 38(-6.35,2.54) 39(-3.81,-2.54) 40(-3.81,2.54) 41(-1.27,-2.54) 42(-1.27,2.54) 43(1.27,-2.54) 44(1.27,2.54) 45(3.81,-2.54) 46(3.81,2.54) 47(6.35,-2.54) 48(6.35,2.54) 49(8.89,-2.54) 50(8.89,2.54) 51(11.43,-2.54) 52(11.43,2.54) 53(13.97,-2.54) 54(13.97,2.54) 55(16.51,-2.54) 56(16.51,2.54) 57(19.05,-2.54) 58(19.05,2.54) 59(21.59,-2.54) 60(21.59,2.54) 61(24.13,-2.54) 62(24.13,2.54) 63(26.67,-2.54) 64(26.67,2.54) 65(29.21,-2.54) 66(29.21,2.54) 67(31.75,-2.54) 68(31.75,2.54) 69(34.29,-2.54) 70(34.29,2.54) 71(36.83,-2.54) 72(36.83,2.54) 73(39.37,-2.54) 74(39.37,2.54) 75(41.91,-2.54) 76(41.91,2.54) 77(44.45,-2.54) 78(44.45,2.54) 79(46.99,-2.54) 80(46.99,2.54) 81(49.53,-2.54) 82(49.53,2.54) 83(52.07,-2.54) 84(52.07,2.54)
Top Overlay:
  lines w0.203: -53.469,-3.695 53.469,-3.695 53.469,3.695 -53.469,3.695 -53.469,-3.695
  text "1" at -52.578,-5.588 h1.42
  text "2" at -52.578,4.064 h1.42
Mechanical 16:
  drawing of 336 lines, arcs and shapes, not listed